# Altium footprint library SMT.PcbLib: 379 footprints (part 17 of 24)
Each footprint in its own frame and in the unit in brackets; x right, y up, seen from the top. Pads: shape width x height; smd on the part's side, far side on the other; paste and mask are expansions set on the pad; w line width, h text height; cw(c..) or ccw(c..) is an arc to the next point about the centre after c.
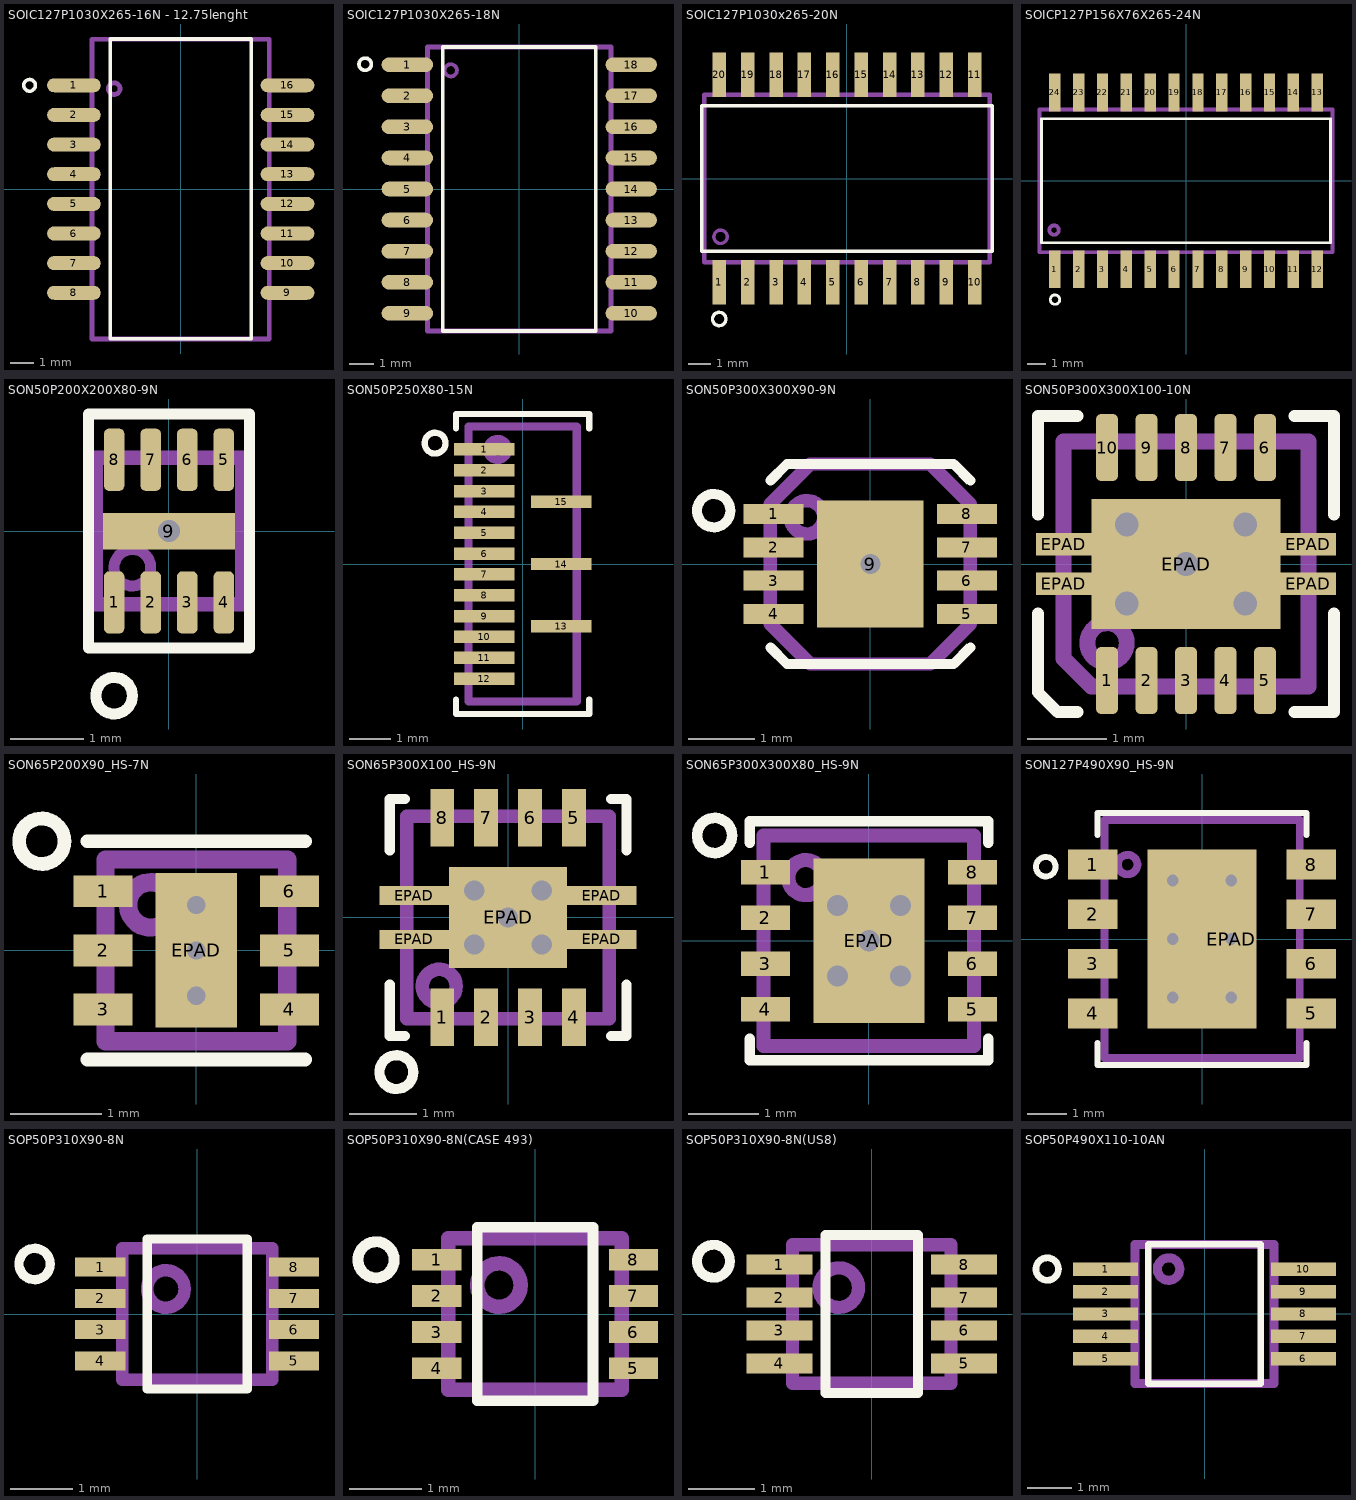
[diagram p16: the footprints below, top view; thin cyan lines are the x and y axes]

## SOIC127P1030X265-16N - 12.75lenght [mm] "SOIC, 16-Leads, Body 12,75x7,50mm, Pitch 1,27mm, IPC Medium Density"
height 2.65
pads (16):
  oval 2.3x0.6 smd: 1(-4.575,4.445) 2(-4.575,3.175) 3(-4.575,1.905) 4(-4.575,0.635) 5(-4.575,-0.635) 6(-4.575,-1.905) 7(-4.575,-3.175) 8(-4.575,-4.445) 9(4.575,-4.445) 10(4.575,-3.175) 11(4.575,-1.905) 12(4.575,-0.635) 13(4.575,0.635) 14(4.575,1.905) 15(4.575,3.175) 16(4.575,4.445)
Top Overlay:
  circle w0.15: c-6.477,4.445 r0.25
  lines w0.15: -3.025,-6.421 3.025,-6.421 3.025,6.429 -3.025,6.429 -3.025,-6.421
Mechanical 1:
  circle w0.2: c-2.85,4.3 r0.25
  lines w0.2: -3.8,-6.425 3.8,-6.425 3.8,6.425 -3.8,6.425 -3.8,-6.425
3D body: height 2.64, standoff 0.1, extent -3.8,-6.425 3.8,6.425

## SOIC127P1030X265-18N [mm] "SOIC, 18-Leads, Body 11,55x7,50mm, Pitch 1,27mm, IPC Medium Density"
height 2.65
pads (18):
  oval 2.1x0.6 smd: 1(-4.575,5.08) 2(-4.575,3.81) 3(-4.575,2.54) 4(-4.575,1.27) 5(-4.575,0) 6(-4.575,-1.27) 7(-4.575,-2.54) 8(-4.575,-3.81) 9(-4.575,-5.08) 10(4.575,-5.08) 11(4.575,-3.81) 12(4.575,-2.54) 13(4.575,-1.27) 14(4.575,0) 15(4.575,1.27) 16(4.575,2.54) 17(4.575,3.81) 18(4.575,5.08)
Top Overlay:
  circle w0.15: c-6.3,5.1 r0.25
  lines w0.15: -3.125,-5.8 -3.125,5.8 3.125,5.8 3.125,-5.8 -3.125,-5.8
Mechanical 1:
  circle w0.15: c-2.8,4.85 r0.25
  lines w0.2: -3.75,-5.8 -3.75,5.8 3.75,5.8 3.75,-5.8 -3.75,-5.8
3D body "SO18W.STEP": height 2.55, standoff 0, extent -5.1,-5.775 5.2,5.775

## SOIC127P1030x265-20N [mm]
height 1.27
pads (20):
  rect 0.6x2 smd paste+0: 1(-5.715,-4.65) 2(-4.445,-4.65) 3(-3.175,-4.65) 4(-1.905,-4.65) 5(-0.635,-4.65) 6(0.635,-4.65) 7(1.905,-4.65) 8(3.175,-4.65) 9(4.445,-4.65) 10(5.715,-4.65) 11(5.715,4.65) 12(4.445,4.65) 13(3.175,4.65) 14(1.905,4.65) 15(0.635,4.65) 16(-0.635,4.65) 17(-1.905,4.65) 18(-3.175,4.65) 19(-4.445,4.65) 20(-5.715,4.65)
Top Overlay:
  circle w0.15: c-5.72,-6.29 r0.3
  lines w0.15: -6.5,-3.25 -6.5,3.25 6.5,3.25 6.5,-3.25 -6.5,-3.25
Mechanical 1:
  circle w0.15: c-5.66,-2.61 r0.3
  lines w0.2: -5.715,-5.175 -5.715,-3.75 ; -5.715,3.75 -5.715,5.175 ; -4.445,-5.175 -4.445,-3.75 ; -4.445,3.75 -4.445,5.175 ; -3.175,-5.175 -3.175,-3.75 ; -3.175,3.75 -3.175,5.175 ; -1.905,-5.175 -1.905,-3.75 ; -1.905,3.75 -1.905,5.175 ; -0.635,-5.175 -0.635,-3.75 ; -0.635,3.75 -0.635,5.175 ; 0.635,-5.175 0.635,-3.75 ; 0.635,3.75 0.635,5.175 ; 1.905,-5.175 1.905,-3.75 ; 1.905,3.75 1.905,5.175 ; 3.175,-5.175 3.175,-3.75 ; 3.175,3.75 3.175,5.175 ; 4.445,-5.175 4.445,-3.75 ; 4.445,3.75 4.445,5.175 ; 5.715,-5.175 5.715,-3.75 ; 5.715,3.75 5.715,5.175 ; -6.4,-3.75 -6.4,3.75 6.4,3.75 6.4,-3.75 -6.4,-3.75
3D body "User Library-SOIC20.STEP": height 2.25, standoff 0.01, extent -6.3,-5.067 6.3,5.067

## SOICP127P156X76X265-24N [mm] "body:15,6x7,6x2,65; 24-leads"
height 2.65
pads (24):
  rect 0.6x2 smd paste-0.025 mask+0.07: 1(-6.985,-4.7) 2(-5.715,-4.7) 3(-4.445,-4.7) 4(-3.175,-4.7) 5(-1.905,-4.7) 6(-0.635,-4.7) 7(0.635,-4.7) 8(1.905,-4.7) 9(3.175,-4.7) 10(4.445,-4.7) 11(5.715,-4.7) 12(6.985,-4.7) 13(6.985,4.7) 14(5.715,4.7) 15(4.445,4.7) 16(3.175,4.7) 17(1.905,4.7) 18(0.635,4.7) 19(-0.635,4.7) 20(-1.905,4.7) 21(-3.175,4.7) 22(-4.445,4.7) 23(-5.715,4.7) 24(-6.985,4.7)
Top Overlay:
  circle w0.15: c-6.975,-6.325 r0.25
  lines w0.15: -7.7,-3.3 -7.7,3.3 7.7,3.3 7.7,-3.3 -7.7,-3.3
Mechanical 1:
  circle w0.2: c-7.025,-2.625 r0.25
  lines w0.2: -7.8,-3.8 -7.8,3.8 7.8,3.8 7.8,-3.8 -7.8,-3.8
3D body "SW3dPS-SOIC24-300.STEP": height 2.65, standoff 0, extent -7.75,-5.15 7.75,5.15

## SON50P200X200X80-9N [mm] "SON, 8-Leads, Body 2,0x2,0mm (max), Pitch 0,50mm, IPC Medium Density"
height 0.8
pads (9):
  rrect50% 0.28x0.85 smd paste-0.025 mask+0.03: 1(-0.75,-0.975) 2(-0.25,-0.975) 3(0.25,-0.975) 4(0.75,-0.975) 5(0.75,0.975) 6(0.25,0.975) 7(-0.25,0.975) 8(-0.75,0.975)
  rect 1.8x0.5 hole 0.3 paste-0.05: 9(0,0)
Top Overlay:
  circle w0.15: c-0.75,-2.25 r0.25
  lines w0.15: -1.1,-1.6 1.1,-1.6 1.1,1.6 -1.1,1.6 -1.1,-1.6
Top Paste:
  rectangle: -0.875,-0.25 0.9,0.2
Mechanical 1:
  circle w0.15: c-0.5,-0.5 r0.25
  lines w0.2: -1,-1 -1,1 1,1 1,-1 -1,-1
3D body "DRF(S-PWSON-N8).STEP": height 0.8, standoff 0, extent -1,-1 1,1

## SON50P250X80-15N [mm] "SON, 24-Leads, Body 6,50x2,50mm, Pitch 0,50mm, IPC Medium Density"
height 0.8
pads (15):
  rect 1.45x0.3 smd paste-0.025 mask+0.04: 1(-0.925,2.75) 2(-0.925,2.25) 3(-0.925,1.75) 4(-0.925,1.25) 5(-0.925,0.75) 6(-0.925,0.25) 7(-0.925,-0.25) 8(-0.925,-0.75) 9(-0.925,-1.25) 10(-0.925,-1.75) 11(-0.925,-2.25) 12(-0.925,-2.75) 13(0.925,-1.5) 14(0.925,0) 15(0.925,1.5)
Top Overlay:
  circle w0.15: c-2.1,2.9 r0.25
  lines w0.15: -1.6,-3.25 -1.6,-3.6 1.6,-3.6 1.6,-3.25 ; -1.6,3.25 -1.6,3.6 1.6,3.6 1.6,3.25
Mechanical 1:
  circle w0.2: c-0.6,2.75 r0.25
  lines w0.2: -1.3,-3.3 1.3,-3.3 1.3,3.3 -1.3,3.3 -1.3,-3.3
3D body "Деталь.stp": height 0.81, standoff 0.01, extent -1.35,-3.3 1.35,3.3

## SON50P300X300X90-9N [mm] "SON, 8-Leads, Body 3,0x3,0mm (max), Pitch 0,50mm, IPC Medium Density"
height 0.9
pads (9):
  rect 0.9x0.3 smd mask+0.03: 1(-1.45,0.75) 2(-1.45,0.25) 3(-1.45,-0.25) 4(-1.45,-0.75) 5(1.45,-0.75) 6(1.45,-0.25) 7(1.45,0.25) 8(1.45,0.75)
  rect 1.6x1.9 hole 0.3 mask+0.05: 9(0,0)
Top Overlay:
  circle w0.15: c-2.35,0.8 r0.25
  lines w0.15: -1.5,-1.25 -1.25,-1.5 1.25,-1.5 1.5,-1.25 ; -1.5,1.25 -1.25,1.5 1.25,1.5 1.5,1.25
Top Paste:
  region: -0.7,0.9 -0.7,-0.9 0.7,-0.9 0.7,0.9
Mechanical 1:
  circle w0.2: c-0.95,0.7 r0.25
  lines w0.2: -1.5,-0.9 -1.5,0.9 -0.9,1.5 0.9,1.5 1.5,0.9 1.5,-0.9 0.9,-1.5 -0.9,-1.5 -1.5,-0.9
3D body "User Library-DFN-8.STEP": height 0.8, standoff 0, extent -1.51,-1.5 1.51,1.5

## SON50P300X300X100-10N [mm] "SON, 10-Leads, Body 3,0x3,0mm (max), Pitch 0,50mm, IPC Medium Density"
height 1
pads (15):
  rrect50% 0.28x0.85 smd mask+0.05: 1(-1,-1.475) 2(-0.5,-1.475) 3(0,-1.475) 4(0.5,-1.475) 5(1,-1.475) 6(1,1.475) 7(0.5,1.475) 8(0,1.475) 9(-0.5,1.475) 10(-1,1.475)
  rect 0.7x0.28 smd paste-5 mask+0.04: EPAD(-1.55,-0.25) EPAD(-1.55,0.25) EPAD(1.55,-0.25) EPAD(1.55,0.25)
  rect 2.4x1.65 hole 0.3 paste-25 mask+0.05: EPAD(0,0)
via -0.75,0.5 diameter 0.6 hole 0.3
via 0.75,0.5 diameter 0.6 hole 0.3
via -0.75,-0.5 diameter 0.6 hole 0.3
via 0.75,-0.5 diameter 0.6 hole 0.3
Top Overlay:
  lines w0.15: -1.875,-0.625 -1.875,-1.45 -1.875,-1.625 -1.625,-1.875 -1.375,-1.875 ; -1.875,0.625 -1.875,1.875 -1.375,1.875 ; 1.375,-1.875 1.875,-1.875 1.875,-0.625 ; 1.375,1.875 1.875,1.875 1.875,0.625
Top Paste:
  rectangle: -1.8,-0.38 -1.3,-0.12
  rectangle: 0.11,0.11 1.16,0.79
  rectangle: -1.16,0.11 -0.11,0.79
  rectangle: 0.11,-0.79 1.16,-0.11
  rectangle: -1.16,-0.79 -0.11,-0.11
  rectangle: 1.3,0.12 1.8,0.38
  rectangle: 1.3,-0.38 1.8,-0.12
  rectangle: -1.8,0.12 -1.3,0.38
Mechanical 1:
  circle w0.2: c-1,-1 r0.25
  lines w0.2: -1.55,-1.2 -1.2,-1.55 1.55,-1.55 1.55,1.55 -1.55,1.55 -1.55,-1.2
3D body "User Library-DRC (S-PVSON-N10)-1.STEP": height 1, standoff 0, extent -1.575,-1.575 1.575,1.575

## SON65P200X90_HS-7N [mm] "SON, 6-Leads, Body 2,00x2,00mm, Pitch 0,65mm, Thermal Pad 1,60x1mm, IPC Medium Density"
height 0.9
pads (7):
  rect 0.65x0.35 smd mask+0.05: 1(-1.025,0.65) 2(-1.025,0) 3(-1.025,-0.65) 4(1.025,-0.65) 5(1.025,0) 6(1.025,0.65)
  rect 0.9x1.7 hole 0.2 paste-10 mask+0.05: EPAD(0,0)
via 0,0.5 diameter 0.45 hole 0.2
via 0,-0.5 diameter 0.45 hole 0.2
Top Overlay:
  circle w0.15: c-1.7,1.2 r0.25
  lines w0.15: -1.2,-1.2 0.8,-1.2 ; -1.2,1.2 0.8,1.2 ; 0.74,-1.2 1.2,-1.2 ; 0.74,1.2 1.2,1.2
Top Paste:
  region: 0.45,-0.8 -0.45,-0.8 -0.45,0.8 0.45,0.8
Mechanical 1:
  circle w0.2: c-0.5,0.5 r0.25
  lines w0.2: -1,-1 1,-1 1,1 -1,1 -1,-1
3D body "SON65P200X90_HS-7N.step": height 0.9, standoff 0, extent -1.125,-1.025 1.125,1.025

## SON65P300X100_HS-9N [mm] "SON, 8-Leads, Body 3,00x3,00mm, Pitch 0,65mm, Thermal Pad 2,40x1,49mm, IPC Medium Density"
height 1
pads (13):
  rect 0.35x0.85 smd paste-0.025 mask+0.07: 1(-0.975,-1.475) 2(-0.325,-1.475) 3(0.325,-1.475) 4(0.975,-1.475) 5(0.975,1.475) 6(0.325,1.475) 7(-0.325,1.475) 8(-0.975,1.475)
  rect 1.025x0.28 smd paste-20 mask+0.07: EPAD(-1.388,-0.325) EPAD(-1.388,0.325) EPAD(1.388,-0.325) EPAD(1.388,0.325)
  rect 1.75x1.5 hole 0.3 paste-20 mask+0.07: EPAD(0,0)
via -0.5,0.4 diameter 0.6 hole 0.3
via -0.5,-0.4 diameter 0.6 hole 0.3
via 0.5,-0.4 diameter 0.6 hole 0.3
via 0.5,0.4 diameter 0.6 hole 0.3
Top Overlay:
  circle w0.15: c-1.651,-2.286 r0.25
  lines w0.15: -1.75,-0.995 -1.75,-1.75 -1.525,-1.75 ; -1.75,0.995 -1.75,1.75 -1.525,1.75 ; 1.525,-1.75 1.75,-1.75 1.75,-0.995 ; 1.525,1.75 1.75,1.75 1.75,0.995
Top Paste:
  region: -1.875,-0.44 -1.875,-0.21 -0.975,-0.21 -0.975,-0.44
  region: -1.875,0.21 -1.875,0.44 -0.975,0.44 -0.975,0.21
  region: 1.875,0.21 1.875,0.44 0.975,0.44 0.975,0.21
  region: 1.875,-0.44 1.875,-0.21 0.975,-0.21 0.975,-0.44
  region: -0.775,0.65 0.775,0.65 0.775,-0.65 -0.775,-0.65
Mechanical 1:
  circle w0.2: c-1.016,-1.016 r0.25
  lines w0.2: -1.5,-1.5 1.5,-1.5 1.5,1.5 -1.5,1.5 -1.5,-1.5
3D body "QFN65P300X300X100_HS-13N.step": height 1, standoff 0, extent -1.5,-1.502 1.502,1.5

## SON65P300X300X80_HS-9N [mm] "SON, 8-Leads, Body 3,00x3,00mm, Pitch 0,65mm, Thermal Pad 2,40x1,60mm, IPC Medium Density"
height 0.8
pads (9):
  rect 0.7x0.35 smd mask+0.05: 1(-1.475,0.975) 2(-1.475,0.325) 3(-1.475,-0.325) 4(-1.475,-0.975) 5(1.475,-0.975) 6(1.475,-0.325) 7(1.475,0.325) 8(1.475,0.975)
  rect 1.58x2.35 hole 0.3 paste-10 mask+0.05: EPAD(0,0)
via 0.45,-0.5 diameter 0.6 hole 0.3
via -0.45,-0.5 diameter 0.6 hole 0.3
via -0.45,0.5 diameter 0.6 hole 0.3
via 0.45,0.5 diameter 0.6 hole 0.3
Top Overlay:
  circle w0.15: c-2.2,1.5 r0.25
  lines w0.15: -1.7,-1.4 -1.7,-1.7 1.7,-1.7 1.7,-1.4 ; -1.7,1.4 -1.7,1.7 1.7,1.7 1.7,1.4
Top Paste:
  region: -0.65,-0.8 0.65,-0.8 0.65,0.8 -0.65,0.8
Mechanical 1:
  circle w0.2: c-0.9,0.9 r0.25
  lines w0.2: -1.5,-1.5 1.5,-1.5 1.5,1.5 -1.5,1.5 -1.5,-1.5
3D body "SON65P300X80_HS-9N.step": height 0.8, standoff 0, extent -1.55,-1.5 1.55,1.5

## SON127P490X90_HS-9N [mm] "SON, 8-Leads, Body 6,00x4,90mm, Pitch 1,27mm, Thermal Pad 4,57x2,79mm, IPC Medium Density"
height 0.9
pads (9):
  rect 1.27x0.76 smd: 1(-2.795,1.905) 2(-2.795,0.635) 3(-2.795,-0.635) 4(-2.795,-1.905) 5(2.795,-1.905) 6(2.795,-0.635) 7(2.795,0.635) 8(2.795,1.905)
  rect 2.79x4.57 hole 0.3 copper offset -0.75,0 paste-1.395: EPAD(0.75,0)
via -0.75,1.5 diameter 0.7 hole 0.3
via 0.75,1.5 diameter 0.7 hole 0.3
via -0.75,0 diameter 0.7 hole 0.3
via 0.75,-1.5 diameter 0.7 hole 0.3
via -0.75,-1.5 diameter 0.7 hole 0.3
Top Overlay:
  circle w0.15: c-4,1.85 r0.25
  lines w0.15: -2.675,-2.66 -2.675,-3.225 2.675,-3.225 2.675,-2.66 ; -2.675,2.66 -2.675,3.225 2.675,3.225 2.675,2.66
Top Paste:
  rectangle: -1.3,1.24 -0.1,2.18
  rectangle: -1.3,0.1 -0.1,1.04
  rectangle: -1.3,-1.04 -0.1,-0.1
  rectangle: -1.3,-2.18 -0.1,-1.24
  rectangle: 0.1,1.24 1.3,2.18
  rectangle: 0.1,0.1 1.3,1.04
  rectangle: 0.1,-1.04 1.3,-0.1
  rectangle: 0.1,-2.18 1.3,-1.24
  region: -0.05,1 -1,1 -1,2 -0.05,2 -0.05,1 -1,1 -1,2 -0.05,2 -0.05,1 -1,1 -0.05,1 -0.05,2
Mechanical 1:
  circle w0.2: c-1.905,1.905 r0.25
  lines w0.2: -2.5,-3.05 -2.5,3.05 2.5,3.05 2.5,-3.05 -2.5,-3.05

## SOP50P310X90-8N [mm] "SOP, 8-Leads, Body 2,1x2,4mm (max), Pitch 0,50mm, IPC Medium Density"
height 0.9
pads (8):
  rect 0.8x0.3 smd paste-0.05 mask+0.03: 1(-1.55,0.75) 2(-1.55,0.25) 3(-1.55,-0.25) 4(-1.55,-0.75) 5(1.55,-0.75) 6(1.55,-0.25) 7(1.55,0.25) 8(1.55,0.75)
Top Overlay:
  circle w0.15: c-2.6,0.8 r0.25
  lines w0.15: -0.8,-1.2 0.8,-1.2 0.8,1.2 -0.8,1.2 -0.8,-1.2
Mechanical 1:
  circle w0.2: c-0.5,0.4 r0.3
  lines w0.2: -1.2,-1.05 -1.2,1.05 1.2,1.05 1.2,-1.05 -1.2,-1.05
3D body "User Library-MO-187FMSOP-8 (MO-187CA).stp": height 1.1, standoff 0, extent -1.559,-1 1.56,1

## SOP50P310X90-8N(CASE 493) [mm] "SOP, 8-Leads, Body 2,1x2,4x0,9mm (max), Pitch 0,50mm, IPC Medium Density"
height 0.9
pads (8):
  rect 0.68x0.3 smd paste-0.05 mask+0.03: 1(-1.36,0.75) 2(-1.36,0.25) 3(-1.36,-0.25) 4(-1.36,-0.75) 5(1.36,-0.75) 6(1.36,-0.25) 7(1.36,0.25) 8(1.36,0.75)
Top Overlay:
  circle w0.15: c-2.2,0.75 r0.25
  lines w0.15: -0.8,-1.2 -0.8,1.2 0.8,1.2 0.8,-1.2 -0.8,-1.2
Mechanical 1:
  circle w0.2: c-0.5,0.4 r0.3
  lines w0.2: -1.2,-1.05 1.2,-1.05 1.2,1.05 -1.2,1.05 -1.2,-1.05
3D body "User Library-MO-187FMSOP-8 (MO-187CA).stp": height 1.1, standoff 0, extent -1.559,-1 1.56,1

## SOP50P310X90-8N(US8) [mm] "SOP, 8-Leads, Body 2,1x2,4mm (max), Pitch 0,50mm, IPC Medium Density"
height 0.9
pads (8):
  rect 1x0.3 smd paste-0.05 mask+0.03: 1(-1.4,0.75) 2(-1.4,0.25) 3(-1.4,-0.25) 4(-1.4,-0.75) 5(1.4,-0.75) 6(1.4,-0.25) 7(1.4,0.25) 8(1.4,0.75)
Top Overlay:
  circle w0.15: c-2.4,0.8 r0.25
  lines w0.15: -0.7,-1.2 0.7,-1.2 0.7,1.2 -0.7,1.2 -0.7,-1.2
Mechanical 1:
  circle w0.2: c-0.5,0.4 r0.3
  lines w0.2: -1.2,-1.05 -1.2,1.05 1.2,1.05 1.2,-1.05 -1.2,-1.05
3D body "User Library-MO-187FMSOP-8 (MO-187CA).stp": height 1.1, standoff 0, extent -1.559,-1 1.56,1

## SOP50P490X110-10AN [mm] "TSSOP, 10-Leads, Body 3,1x3,1mm (max), Pitch 0,50mm, IPC Medium Density"
height 1.1
pads (10):
  rect 1.45x0.3 smd paste-0.05 mask+0.03: 1(-2.2,1) 2(-2.2,0.5) 3(-2.2,0) 4(-2.2,-0.5) 5(-2.2,-1) 6(2.2,-1) 7(2.2,-0.5) 8(2.2,0) 9(2.2,0.5) 10(2.2,1)
Top Overlay:
  circle w0.15: c-3.5,1 r0.25
  lines w0.15: -1.25,-1.55 1.25,-1.55 1.25,1.55 -1.25,1.55 -1.25,-1.55
Mechanical 1:
  circle w0.2: c-0.8,1 r0.25
  lines w0.2: -1.55,-1.55 1.55,-1.55 1.55,1.55 -1.55,1.55 -1.55,-1.55
3D body: height 1.1, standoff 0.15, extent -1.55,-1.55 1.55,1.55